# Altium footprint library Rocket_library.PcbLib: 65 footprints (part 4 of 5)
Each footprint in its own frame and in the unit in brackets; x right, y up, seen from the top. Pads: shape width x height; smd on the part's side, far side on the other; paste and mask are expansions set on the pad; w line width, h text height; cw(c..) or ccw(c..) is an arc to the next point about the centre after c.
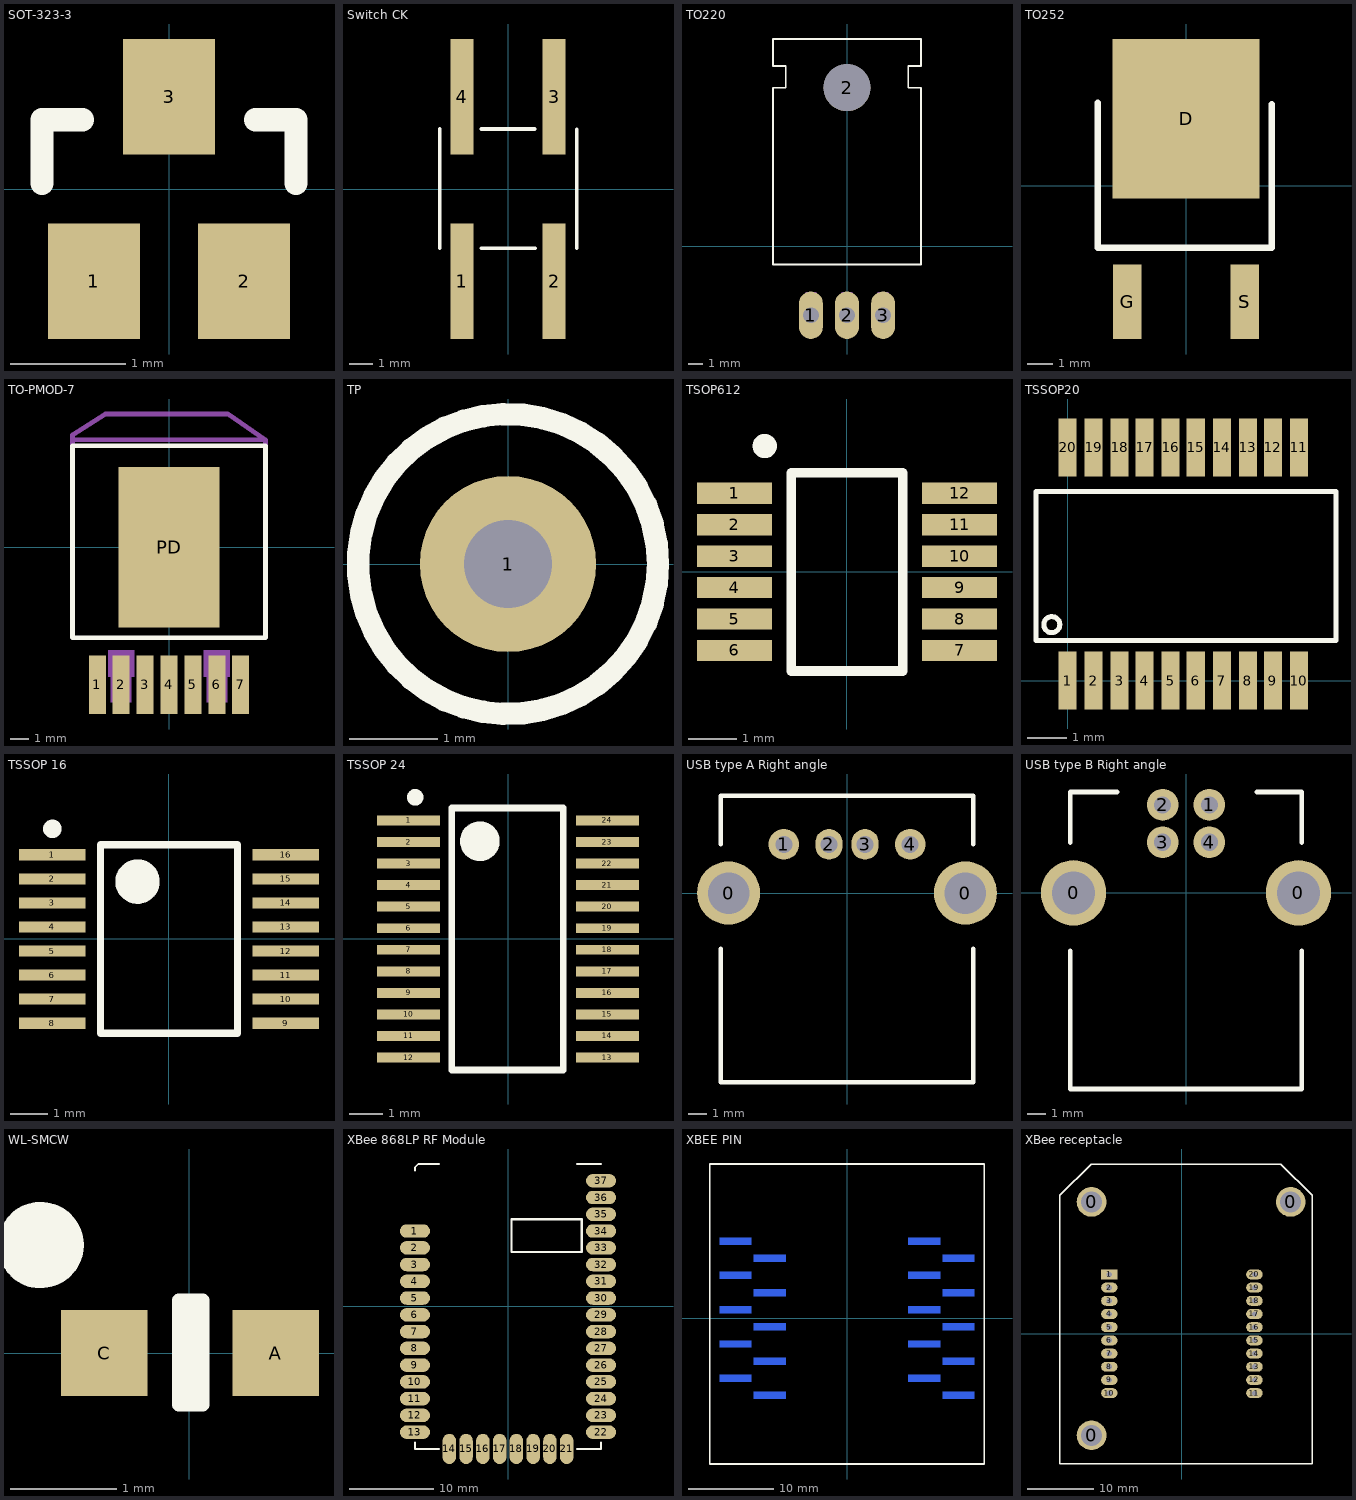
[diagram p3: the footprints below, top view; thin cyan lines are the x and y axes]

## SOT-323-3 [mm]
pads (3):
  rect 0.8x1 smd: 1(-0.65,-0.8) 2(0.65,-0.8) 3(0,0.8)
Top Overlay:
  lines w0.2: -1.1,0.05 -1.1,0.6 -0.75,0.6 ; 0.75,0.6 1.1,0.6 1.1,0.05
3D body "User Library-SOT323 (SC70-3)-1.STEP": height 1.1, standoff 0, extent -1.1,-1.122 1.1,1.123

## Switch CK [mm]
pads (4):
  rect 1x5 smd: 1(-2,-4) 2(2,-4) 3(2,4) 4(-2,4)
Top Overlay:
  lines w0.152: -2.95,-2.575 -2.95,2.6 ; -1.15,-2.575 1.175,-2.575 ; -1.15,2.6 1.15,2.6 ; 2.975,-2.575 2.975,2.591
3D body "User Library-PTS645SL50SMTR92-LFS.STEP": height 5, standoff 0, extent -3,-4.5 3,4.5

## TO220 [mil]
pads (4):
  oval 66x132 hole 44: 1(-100,-190.94) 2(0,-190.94) 3(100,-190.94)
  round 130 hole 130: 2(0,440)
Top Overlay:
  lines w5: -205,-50 -205,440 -170,440 -170,500 -205,500 -205,575 205,575 205,500 170,500 170,440 205,440 205,-50 -205,-50
Mechanical 16:
  rectangle: 85,-200.94 115,-125.94
  rectangle: -15,-200.94 15,-125.94
  rectangle: -115,-200.94 -85,-125.94
3D body "CircuitWorks-TO-220.step": height 165.35, standoff -118.11, extent -199.99,-200.78 200.01,566.54

## TO252 [mm]
pads (3):
  rect 5.7x6.2 smd: D(0,2.6)
  rect 1.1x2.9 smd: G(-2.286,-4.5) S(2.286,-4.5)
Top Overlay:
  lines w0.254: -3.425,3.225 -3.425,-2.4 3.325,-2.4 3.325,3.175
3D body "CircuitWorks-TO-252.step": height 2.3, standoff 0, extent -3.315,-5.148 3.265,4.552

## TO-PMOD-7 [mm]
pads (8):
  rect 0.9x3.1 smd: 1(-3.81,-7.305) 2(-2.54,-7.305) 3(-1.27,-7.305) 4(0,-7.305) 5(1.27,-7.305) 6(2.54,-7.305) 7(3.81,-7.305)
  rect 5.35x8.54 smd: PD(0,0)
Top Overlay:
  lines w0.254: -5.131,-4.8 5.131,-4.8 5.131,5.4 -5.131,5.4 -5.131,-4.8
Mechanical 16:
  rectangle: -3.099,-8.255 -1.981,-6.833
  rectangle: -3.251,-6.883 -1.829,-5.461
  rectangle: 1.981,-8.255 3.099,-6.833
  rectangle: 1.829,-6.883 3.251,-5.461
  lines w0.254: -5.131,-2.819 -5.131,5.969 -3.378,7.087 3.124,7.087 5.131,5.715 ; -5.131,5.715 5.131,5.715 ; 5.131,-2.819 5.131,5.715
3D body "User Library-TO-PMOD-7-1.step": height 4.57, standoff 0, extent -5.08,-8.4 5.08,5.375

## TP [mm]
pads (1):
  round 2 hole 1: 1(0,0)
Top Overlay:
  circle w0.254: c0,0 r1.7
Bottom Overlay:
  circle w0.254: c0,0 r1.7

## TSOP612 [mm] "TSOP, 12-Leads, Body 4.00x3.00mm, Pitch 0.65mm, IPC Low Density"
height 1.1
pads (12):
  rect 1.55x0.44 smd: 1(-2.325,1.625) 2(-2.325,0.975) 3(-2.325,0.325) 4(-2.325,-0.325) 5(-2.325,-0.975) 6(-2.325,-1.625) 7(2.325,-1.625) 8(2.325,-0.975) 9(2.325,-0.325) 10(2.325,0.325) 11(2.325,0.975) 12(2.325,1.625)
Top Overlay:
  circle w0.25: c-1.7,2.6 r0.125
  lines w0.2: -1.15,-2.05 -1.15,2.05 1.15,2.05 1.15,-2.05 -1.15,-2.05
3D body "User Library-msop-12.step": height 1.1, standoff 0, extent -2.45,-2.02 2.45,2.02

## TSSOP20 [mil]
pads (20):
  rect 18x58 smd: 1(0,0) 2(26,0) 3(52,0) 4(77,0) 5(103,0) 6(128,0) 7(154,0) 8(180,0) 9(205,0) 10(231,0) 11(231,233) 12(205,233) 13(180,233) 14(154,233) 15(128,233) 16(103,233) 17(77,233) 18(52,233) 19(26,233) 20(0,233)
Top Overlay:
  circle w5: c-15.75,56 r8
  lines w5: -31.5,40 268,40 268,189 -31.5,189 -31.5,40

## TSSOP 16 [mm]
height 1.2
pads (16):
  rect 1.8x0.3 smd: 1(-3.15,2.275) 2(-3.15,1.625) 3(-3.15,0.975) 4(-3.15,0.325) 5(-3.15,-0.325) 6(-3.15,-0.975) 7(-3.15,-1.625) 8(-3.15,-2.275) 9(3.15,-2.275) 10(3.15,-1.625) 11(3.15,-0.975) 12(3.15,-0.325) 13(3.15,0.325) 14(3.15,0.975) 15(3.15,1.625) 16(3.15,2.275)
Top Overlay:
  circle w0.25: c-3.15,2.975 r0.125
  circle w0.6: c-0.85,1.55 r0.3
  lines w0.2: -1.85,-2.55 -1.85,2.55 1.85,2.55 1.85,-2.55 -1.85,-2.55
3D body "User Library-TSSOP-16 5_1x4_4.STEP": height 1.05, standoff -0.05, extent -3.2,-2.55 3.2,2.55

## TSSOP 24 [mm]
height 1.2
pads (24):
  rect 1.9x0.3 smd: 1(-3,3.575) 2(-3,2.925) 3(-3,2.275) 4(-3,1.625) 5(-3,0.975) 6(-3,0.325) 7(-3,-0.325) 8(-3,-0.975) 9(-3,-1.625) 10(-3,-2.275) 11(-3,-2.925) 12(-3,-3.575) 13(3,-3.575) 14(3,-2.925) 15(3,-2.275) 16(3,-1.625) 17(3,-0.975) 18(3,-0.325) 19(3,0.325) 20(3,0.975) 21(3,1.625) 22(3,2.275) 23(3,2.925) 24(3,3.575)
Top Overlay:
  circle w0.25: c-2.8,4.275 r0.125
  circle w0.6: c-0.85,2.95 r0.3
  lines w0.2: -1.7,-3.95 -1.7,3.95 1.668,3.95 1.668,-3.95 -1.7,-3.95
3D body "User Library-TSSOP24_(JEDEC_MO-153).step": height 1.2, standoff 0, extent -3.278,-3.95 3.278,3.95

## USB type A Right angle [mm]
pads (6):
  round 3.5 hole 2.3: 0(-6.57,0) 0(6.57,0)
  round 1.7 hole 0.95: 1(-3.5,2.7) 4(3.5,2.7)
  oval 1.5x1.7 hole 0.95: 2(-1,2.7) 3(1,2.7)
Top Overlay:
  lines w0.254: -7,-3.1 -7,-10.5 7,-10.5 7,-3.1 ; -7,2.7 -7,5.4 3.8,5.4 7,5.4 7,2.7
3D body "User Library-usb plug type a male.step": height 8.32, standoff 0.08, extent -8,-48.45 8,-0.55
3D body "676433911.stp": height 7.73, standoff -3.7, extent -7.997,-10.2 7.997,5.06

## USB type B Right angle [mm]
pads (6):
  round 3.5 hole 2.3: 0(-6.02,0) 0(6.02,0)
  round 1.7 hole 0.92: 1(1.25,4.71) 2(-1.25,4.71) 3(-1.25,2.71) 4(1.25,2.71)
Top Overlay:
  lines w0.254: -6.2,-3.1 -6.2,-10.5 6.2,-10.5 6.2,-3.1 ; -6.2,2.7 -6.2,5.4 -3.7,5.4 ; 3.8,5.4 6.2,5.4 6.2,2.7
3D body "KUSBXHT-BS1N-O-HRF_rA2.STEP": height 11.05, standoff -4.34, extent -7.35,-10.3 7.3,5.3

## WL-SMCW [mil]
pads (2):
  rect 32x32 smd: A(32,0) C(-31.5,0)
Top Overlay:
  circle w16: c-55.12,40 r8
  lines w5: 0.98,-19.09 0.98,17.82 ; -3.94,-19.09 -3.94,19.52 4.92,19.52 4.92,-19.09 -3.94,-19.09
3D body "WL-SMCW_0603_LED.stp": height 27.56, standoff 0, extent -31.49,-15.74 31.5,15.75

## XBee 868LP RF Module [mm]
height 2.54
pads (37):
  oval 3.6x1.6 smd: 1(-11.1,9) 2(-11.1,7) 3(-11.1,5) 4(-11.1,3) 5(-11.1,1) 6(-11.1,-1) 7(-11.1,-3) 8(-11.1,-5) 9(-11.1,-7) 10(-11.1,-9) 11(-11.1,-11) 12(-11.1,-13) 13(-11.1,-15) 22(11.1,-15) 23(11.1,-13) 24(11.1,-11) 25(11.1,-9) 26(11.1,-7) 27(11.1,-5) 28(11.1,-3) 29(11.1,-1) 30(11.1,1) 31(11.1,3) 32(11.1,5) 33(11.1,7) 34(11.1,9) 35(11.1,11) 36(11.1,13) 37(11.1,15)
  oval 1.6x3.6 smd: 14(-7,-17) 15(-5,-17) 16(-3,-17) 17(-1,-17) 18(1,-17) 19(3,-17) 20(5,-17) 21(7,-17)
Top Overlay:
  lines w0.2: -11.1,-16.2 -11.1,-17 -8.2,-17 ; -11.1,16.2 -11.1,16.6 -10.7,17 -8.2,17 ; 8.2,-17 11.1,-17 11.1,-16.2 ; 8.2,17 11.1,17
  lines w0.254: 0.4,6.5 8.8,6.5 8.8,10.4 0.4,10.4 0.4,6.5
3D body "User Library-XBee SMT-1.step": height 3.06, standoff 0, extent -10.998,-17 10.998,16.782

## XBEE PIN [mm]
height 1.2
pads (20):
  rect 3.7x0.8 smd far side: 1(-13,9) 2(-9,7) 3(-13,5) 4(-9,3) 5(-13,1) 6(-9,-1) 7(-13,-3) 8(-9,-5) 9(-13,-7) 10(-9,-9) 11(13,-9) 12(9,-7) 13(13,-5) 14(9,-3) 15(13,-1) 16(9,1) 17(13,3) 18(9,5) 19(13,7) 20(9,9)
Top Overlay:
  lines w0.2: -16,-17 -16,18 16,18 16,-17 -16,-17
3D body "951110-2530-AR.stp": height 6.6, standoff 0, extent -13,-10 -9,10
3D body "951110-2530-AR.stp": height 6.6, standoff 0, extent 9,-10 13,10

## XBee receptacle [mm]
pads (23):
  round 4.5 hole 3.2: 0(-13.7,-15.4) 0(-13.7,20) 0(16.5,20)
  rect 2.5x1.5 hole 0.8: 1(-11,9)
  oval 2.5x1.5 hole 0.8: 2(-11,7) 3(-11,5) 4(-11,3) 5(-11,1) 6(-11,-1) 7(-11,-3) 8(-11,-5) 9(-11,-7) 10(-11,-9) 11(11,-9) 12(11,-7) 13(11,-5) 14(11,-3) 15(11,-1) 16(11,1) 17(11,3) 18(11,5) 19(11,7) 20(11,9)
Top Overlay:
  lines w0.2: -18.5,-19.75 19.75,-19.75 19.75,21 15,25.75 -13.75,25.75 -18.5,21 -18.5,-19.75
3D body "m22-7131042_asm.stp": height 4.4, standoff -2.4, extent 9.8,-10.25 12.2,10.25
3D body "m22-7131042_asm.stp": height 4.4, standoff -2.4, extent -12.2,-10.25 -9.8,10.25
3D body "XBee_module.step": height 10.56, standoff 0.49, extent -18.5,-20 20,26